# Altium footprint library texas.PCBLIB: 124 footprints (part 11 of 12)
Each footprint in its own frame and in the unit in brackets; x right, y up, seen from the top. Pads: shape width x height; smd on the part's side, far side on the other; paste and mask are expansions set on the pad; w line width, h text height; cw(c..) or ccw(c..) is an arc to the next point about the centre after c.
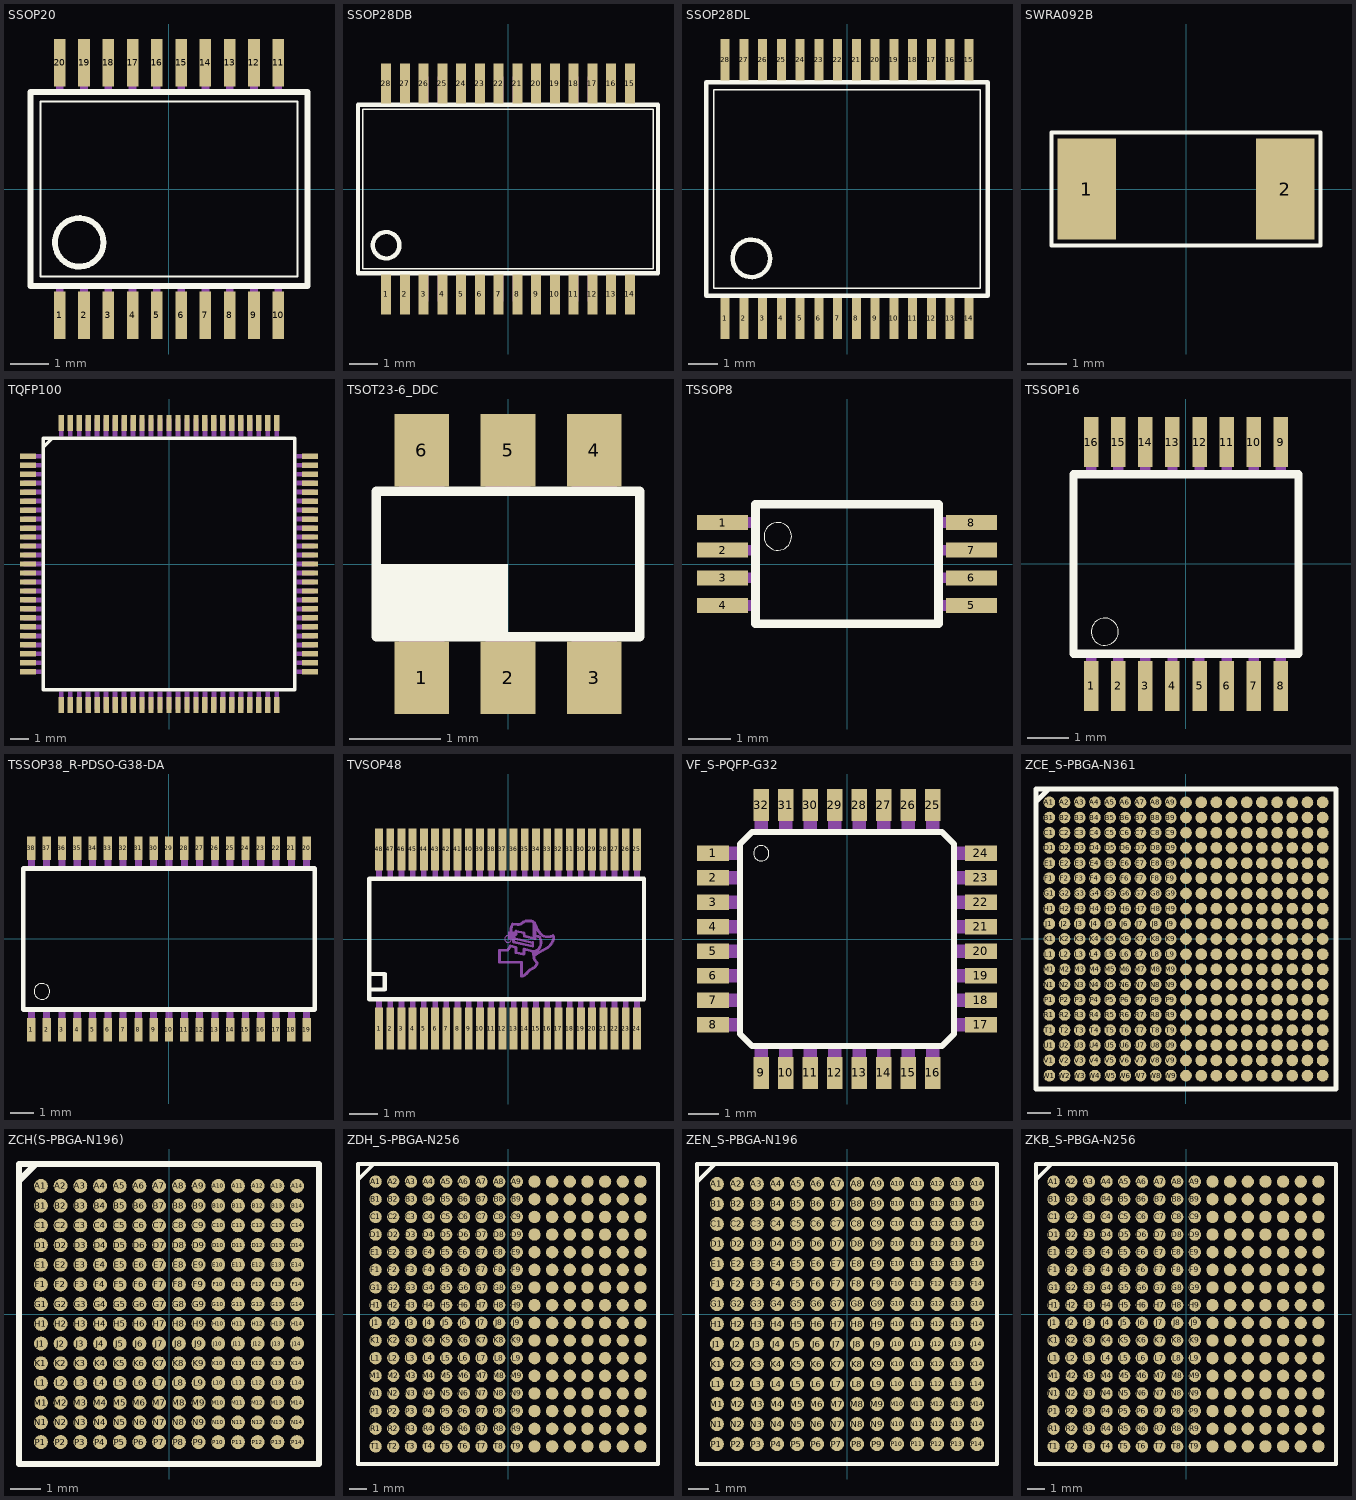
[diagram p10: the footprints below, top view; thin cyan lines are the x and y axes]

## SSOP20 [mil]
pads (20):
  rect 12.01x49.02 smd: 1(-112.48,-130) 2(-87.48,-130) 3(-62.48,-130) 4(-37.48,-130) 5(-12.48,-130) 6(12.52,-130) 7(37.52,-130) 8(62.52,-130) 9(87.52,-130) 10(112.52,-130) 11(112.52,130) 12(87.52,130) 13(62.52,130) 14(37.52,130) 15(12.52,130) 16(-12.48,130) 17(-37.48,130) 18(-62.48,130) 19(-87.48,130) 20(-112.48,130)
Top Overlay:
  circle w6: c-92.48,-55 r25
  lines w2: -132.48,-90 132.52,-90 132.52,90 -132.48,90 -132.48,-90
  lines w6: -142.48,-100 142.52,-100 142.52,100 -142.48,100 -142.48,-100
Mechanical 16:
  rectangle: 108.52,102 116.52,135
  rectangle: 83.52,102 91.52,135
  rectangle: 58.52,102 66.52,135
  rectangle: 33.52,102 41.52,135
  rectangle: 8.52,102 16.52,135
  rectangle: -16.48,102 -8.48,135
  rectangle: -41.48,102 -33.48,135
  rectangle: -66.48,102 -58.48,135
  rectangle: -91.48,102 -83.48,135
  rectangle: -116.48,102 -108.48,135
  rectangle: -116.48,-135 -108.48,-102
  rectangle: -91.48,-135 -83.48,-102
  rectangle: -66.48,-135 -58.48,-102
  rectangle: -41.48,-135 -33.48,-102
  rectangle: -16.48,-135 -8.48,-102
  rectangle: 8.52,-135 16.52,-102
  rectangle: 33.52,-135 41.52,-102
  rectangle: 58.52,-135 66.52,-102
  rectangle: 83.52,-135 91.52,-102
  rectangle: 108.52,-135 116.52,-102

## SSOP28DB [mil]
pads (28):
  rect 13.7x55 smd: 1(-166.34,-143.94) 2(-140.75,-143.94) 3(-115.16,-143.94) 4(-89.57,-143.94) 5(-63.98,-143.94) 6(-38.39,-143.94) 7(-12.8,-143.94) 8(12.8,-143.94) 9(38.39,-143.94) 10(63.98,-143.94) 11(89.57,-143.94) 12(115.16,-143.94) 13(140.75,-143.94) 14(166.34,-143.94) 15(166.34,143.94) 16(140.75,143.94) 17(115.16,143.94) 18(89.57,143.94) 19(63.98,143.94) 20(38.39,143.94) 21(12.8,143.94) 22(-12.8,143.94) 23(-38.39,143.94) 24(-63.98,143.94) 25(-89.57,143.94) 26(-115.16,143.94) 27(-140.75,143.94) 28(-166.34,143.94)
Top Overlay:
  circle w6: c-166.34,-76.77 r18.09
  lines w2: -198.35,-108.78 198.35,-108.78 198.35,108.78 -198.35,108.78 -198.35,-108.78
  lines w6: -204.72,-115.16 204.72,-115.16 204.72,115.16 -204.72,115.16 -204.72,-115.16
Mechanical 16:
  rectangle: -172.74,116.76 -159.94,153.54
  rectangle: -172.74,-153.54 -159.94,-116.76
  rectangle: -147.15,-153.54 -134.35,-116.76
  rectangle: -121.56,-153.54 -108.76,-116.76
  rectangle: -147.15,116.76 -134.35,153.54
  rectangle: -121.56,116.76 -108.76,153.54
  rectangle: -95.96,116.76 -83.17,153.54
  rectangle: -70.37,116.76 -57.58,153.54
  rectangle: -44.78,116.76 -31.99,153.54
  rectangle: -19.19,116.76 -6.4,153.54
  rectangle: 6.4,116.76 19.19,153.54
  rectangle: 31.99,116.76 44.78,153.54
  rectangle: 57.58,116.76 70.37,153.54
  rectangle: 83.17,116.76 95.96,153.54
  rectangle: 108.76,116.76 121.56,153.54
  rectangle: 134.35,116.76 147.15,153.54
  rectangle: 159.94,116.76 172.74,153.54
  rectangle: -95.96,-153.54 -83.17,-116.76
  rectangle: -70.37,-153.54 -57.58,-116.76
  rectangle: -44.78,-153.54 -31.99,-116.76
  rectangle: -19.19,-153.54 -6.4,-116.76
  rectangle: 6.4,-153.54 19.19,-116.76
  rectangle: 31.99,-153.54 44.78,-116.76
  rectangle: 57.58,-153.54 70.37,-116.76
  rectangle: 83.17,-153.54 95.96,-116.76
  rectangle: 108.76,-153.54 121.56,-116.76
  rectangle: 134.35,-153.54 147.15,-116.76
  rectangle: 159.94,-153.54 172.74,-116.76

## SSOP28DL [mil]
pads (28):
  rect 12x55 smd: 1(-162.5,-172.5) 2(-137.5,-172.5) 3(-112.5,-172.5) 4(-87.5,-172.5) 5(-62.5,-172.5) 6(-37.5,-172.5) 7(-12.5,-172.5) 8(12.5,-172.5) 9(37.5,-172.5) 10(62.5,-172.5) 11(87.5,-172.5) 12(112.5,-172.5) 13(137.5,-172.5) 14(162.5,-172.5) 15(162.5,172.5) 16(137.5,172.5) 17(112.5,172.5) 18(87.5,172.5) 19(62.5,172.5) 20(37.5,172.5) 21(12.5,172.5) 22(-12.5,172.5) 23(-37.5,172.5) 24(-62.5,172.5) 25(-87.5,172.5) 26(-112.5,172.5) 27(-137.5,172.5) 28(-162.5,172.5)
Top Overlay:
  circle w6: c-127.5,-92.5 r25
  lines w2: -177.52,-132.52 177.52,-132.52 177.52,132.52 -177.52,132.52 -177.52,-132.52
  lines w6: -187.52,-142.52 187.52,-142.52 187.52,142.52 -187.52,142.52 -187.52,-142.52
Mechanical 16:
  rectangle: -166.5,144.5 -158.5,177.5
  rectangle: -141.5,144.5 -133.5,177.5
  rectangle: -116.5,144.5 -108.5,177.5
  rectangle: -91.5,144.5 -83.5,177.5
  rectangle: -66.5,144.5 -58.5,177.5
  rectangle: -41.5,144.5 -33.5,177.5
  rectangle: -16.5,144.5 -8.5,177.5
  rectangle: 8.5,144.5 16.5,177.5
  rectangle: 33.5,144.5 41.5,177.5
  rectangle: 58.5,144.5 66.5,177.5
  rectangle: 83.5,144.5 91.5,177.5
  rectangle: 108.5,144.5 116.5,177.5
  rectangle: 133.5,144.5 141.5,177.5
  rectangle: 158.5,144.5 166.5,177.5
  rectangle: 158.5,-177.5 166.5,-144.5
  rectangle: 133.5,-177.5 141.5,-144.5
  rectangle: 108.5,-177.5 116.5,-144.5
  rectangle: 83.5,-177.5 91.5,-144.5
  rectangle: 58.5,-177.5 66.5,-144.5
  rectangle: 33.5,-177.5 41.5,-144.5
  rectangle: 8.5,-177.5 16.5,-144.5
  rectangle: -16.5,-177.5 -8.5,-144.5
  rectangle: -41.5,-177.5 -33.5,-144.5
  rectangle: -66.5,-177.5 -58.5,-144.5
  rectangle: -91.5,-177.5 -83.5,-144.5
  rectangle: -116.5,-177.5 -108.5,-144.5
  rectangle: -141.5,-177.5 -133.5,-144.5
  rectangle: -166.5,-177.5 -158.5,-144.5

## SWRA092B [mm]
pads (2):
  rect 1.5x2.6 smd: 1(-2.55,0) 2(2.55,0)
Top Overlay:
  lines w0.102: -3.45,-1.45 3.45,-1.45 3.45,1.45 -3.45,1.45 -3.45,-1.45

## TQFP100 [mm]
pads (100):
  rect 0.9x0.3 smd: 1(-7.85,6) 2(-7.85,5.5) 3(-7.85,5) 4(-7.85,4.5) 5(-7.85,4) 6(-7.85,3.5) 7(-7.85,3) 8(-7.85,2.5) 9(-7.85,2) 10(-7.85,1.5) 11(-7.85,1) 12(-7.85,0.5) 13(-7.85,0) 14(-7.85,-0.5) 15(-7.85,-1) 16(-7.85,-1.5) 17(-7.85,-2) 18(-7.85,-2.5) 19(-7.85,-3) 20(-7.85,-3.5) 21(-7.85,-4) 22(-7.85,-4.5) 23(-7.85,-5) 24(-7.85,-5.5) 25(-7.85,-6) 51(7.85,-6) 52(7.85,-5.5) 53(7.85,-5) 54(7.85,-4.5) 55(7.85,-4) 56(7.85,-3.5) 57(7.85,-3) 58(7.85,-2.5) 59(7.85,-2) 60(7.85,-1.5) 61(7.85,-1) 62(7.85,-0.5) 63(7.85,0) 64(7.85,0.5) 65(7.85,1) 66(7.85,1.5) 67(7.85,2) 68(7.85,2.5) 69(7.85,3) 70(7.85,3.5) 71(7.85,4) 72(7.85,4.5) 73(7.85,5) 74(7.85,5.5) 75(7.85,6)
  rect 0.3x0.9 smd: 26(-6,-7.85) 27(-5.5,-7.85) 28(-5,-7.85) 29(-4.5,-7.85) 30(-4,-7.85) 31(-3.5,-7.85) 32(-3,-7.85) 33(-2.5,-7.85) 34(-2,-7.85) 35(-1.5,-7.85) 36(-1,-7.85) 37(-0.5,-7.85) 38(0,-7.85) 39(0.5,-7.85) 40(1,-7.85) 41(1.5,-7.85) 42(2,-7.85) 43(2.5,-7.85) 44(3,-7.85) 45(3.5,-7.85) 46(4,-7.85) 47(4.5,-7.85) 48(5,-7.85) 49(5.5,-7.85) 50(6,-7.85) 76(6,7.85) 77(5.5,7.85) 78(5,7.85) 79(4.5,7.85) 80(4,7.85) 81(3.5,7.85) 82(3,7.85) 83(2.5,7.85) 84(2,7.85) 85(1.5,7.85) 86(1,7.85) 87(0.5,7.85) 88(0,7.85) 89(-0.5,7.85) 90(-1,7.85) 91(-1.5,7.85) 92(-2,7.85) 93(-2.5,7.85) 94(-3,7.85) 95(-3.5,7.85) 96(-4,7.85) 97(-4.5,7.85) 98(-5,7.85) 99(-5.5,7.85) 100(-6,7.85)
Top Overlay:
  lines w0.203: -6.998,6.5 -6.5,6.998 ; -6.998,-6.998 6.998,-6.998 6.998,6.998 -6.998,6.998 -6.998,-6.998
Top Paste:
  rectangle: -8.225,5.875 -7.425,6.125
  rectangle: -8.225,5.375 -7.425,5.625
  rectangle: -8.225,4.875 -7.425,5.125
  rectangle: -8.225,4.375 -7.425,4.625
  rectangle: -8.225,3.875 -7.425,4.125
  rectangle: -8.225,3.375 -7.425,3.625
  rectangle: -8.225,2.875 -7.425,3.125
  rectangle: -8.225,2.375 -7.425,2.625
  rectangle: -8.225,1.875 -7.425,2.125
  rectangle: -8.225,1.375 -7.425,1.625
  rectangle: -8.225,0.875 -7.425,1.125
  rectangle: -8.225,0.375 -7.425,0.625
  rectangle: -8.225,-0.125 -7.425,0.125
  rectangle: -8.225,-0.625 -7.425,-0.375
  rectangle: -8.225,-1.125 -7.425,-0.875
  rectangle: -8.225,-1.625 -7.425,-1.375
  rectangle: -8.225,-2.125 -7.425,-1.875
  rectangle: -8.225,-2.625 -7.425,-2.375
  rectangle: -8.225,-3.125 -7.425,-2.875
  rectangle: -8.225,-3.625 -7.425,-3.375
  rectangle: -8.225,-4.125 -7.425,-3.875
  rectangle: -8.225,-4.625 -7.425,-4.375
  rectangle: -8.225,-5.125 -7.425,-4.875
  rectangle: -8.225,-5.625 -7.425,-5.375
  rectangle: -8.225,-6.125 -7.425,-5.875
  region: -5.875,-8.225 -5.875,-7.425 -6.125,-7.425 -6.125,-8.225
  region: -5.375,-8.225 -5.375,-7.425 -5.625,-7.425 -5.625,-8.225
  region: -4.875,-8.225 -4.875,-7.425 -5.125,-7.425 -5.125,-8.225
  region: -4.375,-8.225 -4.375,-7.425 -4.625,-7.425 -4.625,-8.225
  region: -3.875,-8.225 -3.875,-7.425 -4.125,-7.425 -4.125,-8.225
  region: -3.375,-8.225 -3.375,-7.425 -3.625,-7.425 -3.625,-8.225
  region: -2.875,-8.225 -2.875,-7.425 -3.125,-7.425 -3.125,-8.225
  region: -2.375,-8.225 -2.375,-7.425 -2.625,-7.425 -2.625,-8.225
  region: -1.875,-8.225 -1.875,-7.425 -2.125,-7.425 -2.125,-8.225
  region: -1.375,-8.225 -1.375,-7.425 -1.625,-7.425 -1.625,-8.225
  region: -0.875,-8.225 -0.875,-7.425 -1.125,-7.425 -1.125,-8.225
  region: -0.375,-8.225 -0.375,-7.425 -0.625,-7.425 -0.625,-8.225
  region: 0.125,-8.225 0.125,-7.425 -0.125,-7.425 -0.125,-8.225
  region: 0.625,-8.225 0.625,-7.425 0.375,-7.425 0.375,-8.225
  region: 1.125,-8.225 1.125,-7.425 0.875,-7.425 0.875,-8.225
  region: 1.625,-8.225 1.625,-7.425 1.375,-7.425 1.375,-8.225
  region: 2.125,-8.225 2.125,-7.425 1.875,-7.425 1.875,-8.225
  region: 2.625,-8.225 2.625,-7.425 2.375,-7.425 2.375,-8.225
  region: 3.125,-8.225 3.125,-7.425 2.875,-7.425 2.875,-8.225
  region: 3.625,-8.225 3.625,-7.425 3.375,-7.425 3.375,-8.225
  region: 4.125,-8.225 4.125,-7.425 3.875,-7.425 3.875,-8.225
  region: 4.625,-8.225 4.625,-7.425 4.375,-7.425 4.375,-8.225
  region: 5.125,-8.225 5.125,-7.425 4.875,-7.425 4.875,-8.225
  region: 5.625,-8.225 5.625,-7.425 5.375,-7.425 5.375,-8.225
  region: 6.125,-8.225 6.125,-7.425 5.875,-7.425 5.875,-8.225
  region: 8.225,-5.875 7.425,-5.875 7.425,-6.125 8.225,-6.125
  region: 8.225,-5.375 7.425,-5.375 7.425,-5.625 8.225,-5.625
  region: 8.225,-4.875 7.425,-4.875 7.425,-5.125 8.225,-5.125
  region: 8.225,-4.375 7.425,-4.375 7.425,-4.625 8.225,-4.625
  region: 8.225,-3.875 7.425,-3.875 7.425,-4.125 8.225,-4.125
  region: 8.225,-3.375 7.425,-3.375 7.425,-3.625 8.225,-3.625
  region: 8.225,-2.875 7.425,-2.875 7.425,-3.125 8.225,-3.125
  region: 8.225,-2.375 7.425,-2.375 7.425,-2.625 8.225,-2.625
  region: 8.225,-1.875 7.425,-1.875 7.425,-2.125 8.225,-2.125
  region: 8.225,-1.375 7.425,-1.375 7.425,-1.625 8.225,-1.625
  region: 8.225,-0.875 7.425,-0.875 7.425,-1.125 8.225,-1.125
  region: 8.225,-0.375 7.425,-0.375 7.425,-0.625 8.225,-0.625
  region: 8.225,0.125 7.425,0.125 7.425,-0.125 8.225,-0.125
  region: 8.225,0.625 7.425,0.625 7.425,0.375 8.225,0.375
  region: 8.225,1.125 7.425,1.125 7.425,0.875 8.225,0.875
  region: 8.225,1.625 7.425,1.625 7.425,1.375 8.225,1.375
  region: 8.225,2.125 7.425,2.125 7.425,1.875 8.225,1.875
  region: 8.225,2.625 7.425,2.625 7.425,2.375 8.225,2.375
  region: 8.225,3.125 7.425,3.125 7.425,2.875 8.225,2.875
  region: 8.225,3.625 7.425,3.625 7.425,3.375 8.225,3.375
  region: 8.225,4.125 7.425,4.125 7.425,3.875 8.225,3.875
  region: 8.225,4.625 7.425,4.625 7.425,4.375 8.225,4.375
  region: 8.225,5.125 7.425,5.125 7.425,4.875 8.225,4.875
  region: 8.225,5.625 7.425,5.625 7.425,5.375 8.225,5.375
  region: 8.225,6.125 7.425,6.125 7.425,5.875 8.225,5.875
  region: 5.875,8.225 5.875,7.425 6.125,7.425 6.125,8.225
  region: 5.375,8.225 5.375,7.425 5.625,7.425 5.625,8.225
  region: 4.875,8.225 4.875,7.425 5.125,7.425 5.125,8.225
  region: 4.375,8.225 4.375,7.425 4.625,7.425 4.625,8.225
  region: 3.875,8.225 3.875,7.425 4.125,7.425 4.125,8.225
  region: 3.375,8.225 3.375,7.425 3.625,7.425 3.625,8.225
  region: 2.875,8.225 2.875,7.425 3.125,7.425 3.125,8.225
  region: 2.375,8.225 2.375,7.425 2.625,7.425 2.625,8.225
  region: 1.875,8.225 1.875,7.425 2.125,7.425 2.125,8.225
  region: 1.375,8.225 1.375,7.425 1.625,7.425 1.625,8.225
  region: 0.875,8.225 0.875,7.425 1.125,7.425 1.125,8.225
  region: 0.375,8.225 0.375,7.425 0.625,7.425 0.625,8.225
  region: -0.125,8.225 -0.125,7.425 0.125,7.425 0.125,8.225
  region: -0.625,8.225 -0.625,7.425 -0.375,7.425 -0.375,8.225
  region: -1.125,8.225 -1.125,7.425 -0.875,7.425 -0.875,8.225
  region: -1.625,8.225 -1.625,7.425 -1.375,7.425 -1.375,8.225
  region: -2.125,8.225 -2.125,7.425 -1.875,7.425 -1.875,8.225
  region: -2.625,8.225 -2.625,7.425 -2.375,7.425 -2.375,8.225
  region: -3.125,8.225 -3.125,7.425 -2.875,7.425 -2.875,8.225
  region: -3.625,8.225 -3.625,7.425 -3.375,7.425 -3.375,8.225
  region: -4.125,8.225 -4.125,7.425 -3.875,7.425 -3.875,8.225
  region: -4.625,8.225 -4.625,7.425 -4.375,7.425 -4.375,8.225
  region: -5.125,8.225 -5.125,7.425 -4.875,7.425 -4.875,8.225
  region: -5.625,8.225 -5.625,7.425 -5.375,7.425 -5.375,8.225
  region: -6.125,8.225 -6.125,7.425 -5.875,7.425 -5.875,8.225
Top Solder:
  rectangle: -8.35,5.825 -7.3,6.175
  rectangle: -8.35,5.325 -7.3,5.675
  rectangle: -8.35,4.825 -7.3,5.175
  rectangle: -8.35,4.325 -7.3,4.675
  rectangle: -8.35,3.825 -7.3,4.175
  rectangle: -8.35,3.325 -7.3,3.675
  rectangle: -8.35,2.825 -7.3,3.175
  rectangle: -8.35,2.325 -7.3,2.675
  rectangle: -8.35,1.825 -7.3,2.175
  rectangle: -8.35,1.325 -7.3,1.675
  rectangle: -8.35,0.825 -7.3,1.175
  rectangle: -8.35,0.325 -7.3,0.675
  rectangle: -8.35,-0.175 -7.3,0.175
  rectangle: -8.35,-0.675 -7.3,-0.325
  rectangle: -8.35,-1.175 -7.3,-0.825
  rectangle: -8.35,-1.675 -7.3,-1.325
  rectangle: -8.35,-2.175 -7.3,-1.825
  rectangle: -8.35,-2.675 -7.3,-2.325
  rectangle: -8.35,-3.175 -7.3,-2.825
  rectangle: -8.35,-3.675 -7.3,-3.325
  rectangle: -8.35,-4.175 -7.3,-3.825
  rectangle: -8.35,-4.675 -7.3,-4.325
  rectangle: -8.35,-5.175 -7.3,-4.825
  rectangle: -8.35,-5.675 -7.3,-5.325
  rectangle: -8.35,-6.175 -7.3,-5.825
  region: -5.825,-8.35 -5.825,-7.3 -6.175,-7.3 -6.175,-8.35
  region: -5.325,-8.35 -5.325,-7.3 -5.675,-7.3 -5.675,-8.35
  region: -4.825,-8.35 -4.825,-7.3 -5.175,-7.3 -5.175,-8.35
  region: -4.325,-8.35 -4.325,-7.3 -4.675,-7.3 -4.675,-8.35
  region: -3.825,-8.35 -3.825,-7.3 -4.175,-7.3 -4.175,-8.35
  region: -3.325,-8.35 -3.325,-7.3 -3.675,-7.3 -3.675,-8.35
  region: -2.825,-8.35 -2.825,-7.3 -3.175,-7.3 -3.175,-8.35
  region: -2.325,-8.35 -2.325,-7.3 -2.675,-7.3 -2.675,-8.35
  region: -1.825,-8.35 -1.825,-7.3 -2.175,-7.3 -2.175,-8.35
  region: -1.325,-8.35 -1.325,-7.3 -1.675,-7.3 -1.675,-8.35
  region: -0.825,-8.35 -0.825,-7.3 -1.175,-7.3 -1.175,-8.35
  region: -0.325,-8.35 -0.325,-7.3 -0.675,-7.3 -0.675,-8.35
  region: 0.175,-8.35 0.175,-7.3 -0.175,-7.3 -0.175,-8.35
  region: 0.675,-8.35 0.675,-7.3 0.325,-7.3 0.325,-8.35
  region: 1.175,-8.35 1.175,-7.3 0.825,-7.3 0.825,-8.35
  region: 1.675,-8.35 1.675,-7.3 1.325,-7.3 1.325,-8.35
  region: 2.175,-8.35 2.175,-7.3 1.825,-7.3 1.825,-8.35
  region: 2.675,-8.35 2.675,-7.3 2.325,-7.3 2.325,-8.35
  region: 3.175,-8.35 3.175,-7.3 2.825,-7.3 2.825,-8.35
  region: 3.675,-8.35 3.675,-7.3 3.325,-7.3 3.325,-8.35
  region: 4.175,-8.35 4.175,-7.3 3.825,-7.3 3.825,-8.35
  region: 4.675,-8.35 4.675,-7.3 4.325,-7.3 4.325,-8.35
  region: 5.175,-8.35 5.175,-7.3 4.825,-7.3 4.825,-8.35
  region: 5.675,-8.35 5.675,-7.3 5.325,-7.3 5.325,-8.35
  region: 6.175,-8.35 6.175,-7.3 5.825,-7.3 5.825,-8.35
  region: 8.35,-5.825 7.3,-5.825 7.3,-6.175 8.35,-6.175
  region: 8.35,-5.325 7.3,-5.325 7.3,-5.675 8.35,-5.675
  region: 8.35,-4.825 7.3,-4.825 7.3,-5.175 8.35,-5.175
  region: 8.35,-4.325 7.3,-4.325 7.3,-4.675 8.35,-4.675
  region: 8.35,-3.825 7.3,-3.825 7.3,-4.175 8.35,-4.175
  region: 8.35,-3.325 7.3,-3.325 7.3,-3.675 8.35,-3.675
  region: 8.35,-2.825 7.3,-2.825 7.3,-3.175 8.35,-3.175
  region: 8.35,-2.325 7.3,-2.325 7.3,-2.675 8.35,-2.675
  region: 8.35,-1.825 7.3,-1.825 7.3,-2.175 8.35,-2.175
  region: 8.35,-1.325 7.3,-1.325 7.3,-1.675 8.35,-1.675
  region: 8.35,-0.825 7.3,-0.825 7.3,-1.175 8.35,-1.175
  region: 8.35,-0.325 7.3,-0.325 7.3,-0.675 8.35,-0.675
  region: 8.35,0.175 7.3,0.175 7.3,-0.175 8.35,-0.175
  region: 8.35,0.675 7.3,0.675 7.3,0.325 8.35,0.325
  region: 8.35,1.175 7.3,1.175 7.3,0.825 8.35,0.825
  region: 8.35,1.675 7.3,1.675 7.3,1.325 8.35,1.325
  region: 8.35,2.175 7.3,2.175 7.3,1.825 8.35,1.825
  region: 8.35,2.675 7.3,2.675 7.3,2.325 8.35,2.325
  region: 8.35,3.175 7.3,3.175 7.3,2.825 8.35,2.825
  region: 8.35,3.675 7.3,3.675 7.3,3.325 8.35,3.325
  region: 8.35,4.175 7.3,4.175 7.3,3.825 8.35,3.825
  region: 8.35,4.675 7.3,4.675 7.3,4.325 8.35,4.325
  region: 8.35,5.175 7.3,5.175 7.3,4.825 8.35,4.825
  region: 8.35,5.675 7.3,5.675 7.3,5.325 8.35,5.325
  region: 8.35,6.175 7.3,6.175 7.3,5.825 8.35,5.825
  region: 5.825,8.35 5.825,7.3 6.175,7.3 6.175,8.35
  region: 5.325,8.35 5.325,7.3 5.675,7.3 5.675,8.35
  region: 4.825,8.35 4.825,7.3 5.175,7.3 5.175,8.35
  region: 4.325,8.35 4.325,7.3 4.675,7.3 4.675,8.35
  region: 3.825,8.35 3.825,7.3 4.175,7.3 4.175,8.35
  region: 3.325,8.35 3.325,7.3 3.675,7.3 3.675,8.35
  region: 2.825,8.35 2.825,7.3 3.175,7.3 3.175,8.35
  region: 2.325,8.35 2.325,7.3 2.675,7.3 2.675,8.35
  region: 1.825,8.35 1.825,7.3 2.175,7.3 2.175,8.35
  region: 1.325,8.35 1.325,7.3 1.675,7.3 1.675,8.35
  region: 0.825,8.35 0.825,7.3 1.175,7.3 1.175,8.35
  region: 0.325,8.35 0.325,7.3 0.675,7.3 0.675,8.35
  region: -0.175,8.35 -0.175,7.3 0.175,7.3 0.175,8.35
  region: -0.675,8.35 -0.675,7.3 -0.325,7.3 -0.325,8.35
  region: -1.175,8.35 -1.175,7.3 -0.825,7.3 -0.825,8.35
  region: -1.675,8.35 -1.675,7.3 -1.325,7.3 -1.325,8.35
  region: -2.175,8.35 -2.175,7.3 -1.825,7.3 -1.825,8.35
  region: -2.675,8.35 -2.675,7.3 -2.325,7.3 -2.325,8.35
  region: -3.175,8.35 -3.175,7.3 -2.825,7.3 -2.825,8.35
  region: -3.675,8.35 -3.675,7.3 -3.325,7.3 -3.325,8.35
  region: -4.175,8.35 -4.175,7.3 -3.825,7.3 -3.825,8.35
  region: -4.675,8.35 -4.675,7.3 -4.325,7.3 -4.325,8.35
  region: -5.175,8.35 -5.175,7.3 -4.825,7.3 -4.825,8.35
  region: -5.675,8.35 -5.675,7.3 -5.325,7.3 -5.325,8.35
  region: -6.175,8.35 -6.175,7.3 -5.825,7.3 -5.825,8.35
Mechanical 16:
  rectangle: -8.1,5.865 -7.1,6.135
  rectangle: -8.1,5.365 -7.1,5.635
  rectangle: -8.1,4.865 -7.1,5.135
  rectangle: -8.1,4.365 -7.1,4.635
  rectangle: -8.1,3.865 -7.1,4.135
  rectangle: -8.1,3.365 -7.1,3.635
  rectangle: -8.1,2.865 -7.1,3.135
  rectangle: -8.1,2.365 -7.1,2.635
  rectangle: -8.1,1.865 -7.1,2.135
  rectangle: -8.1,1.365 -7.1,1.635
  rectangle: -8.1,0.865 -7.1,1.135
  rectangle: -8.1,0.365 -7.1,0.635
  rectangle: -8.1,-0.135 -7.1,0.135
  rectangle: -8.1,-0.635 -7.1,-0.365
  rectangle: -8.1,-1.135 -7.1,-0.865
  rectangle: -8.1,-1.635 -7.1,-1.365
  rectangle: -8.1,-2.135 -7.1,-1.865
  rectangle: -8.1,-2.635 -7.1,-2.365
  rectangle: -8.1,-3.135 -7.1,-2.865
  rectangle: -8.1,-3.635 -7.1,-3.365
  rectangle: -8.1,-4.135 -7.1,-3.865
  rectangle: -8.1,-4.635 -7.1,-4.365
  rectangle: -8.1,-5.135 -7.1,-4.865
  rectangle: -8.1,-5.635 -7.1,-5.365
  rectangle: -8.1,-6.135 -7.1,-5.865
  rectangle: -6.135,-8.1 -5.865,-7.1
  rectangle: -5.635,-8.1 -5.365,-7.1
  rectangle: -5.135,-8.1 -4.865,-7.1
  rectangle: -4.635,-8.1 -4.365,-7.1
  rectangle: -4.135,-8.1 -3.865,-7.1
  rectangle: -3.635,-8.1 -3.365,-7.1
  rectangle: -3.135,-8.1 -2.865,-7.1
  rectangle: -2.635,-8.1 -2.365,-7.1
  rectangle: -2.135,-8.1 -1.865,-7.1
  rectangle: -1.635,-8.1 -1.365,-7.1
  rectangle: -1.135,-8.1 -0.865,-7.1
  rectangle: -0.635,-8.1 -0.365,-7.1
  rectangle: -0.135,-8.1 0.135,-7.1
  rectangle: 0.365,-8.1 0.635,-7.1
  rectangle: 0.865,-8.1 1.135,-7.1
  rectangle: 1.365,-8.1 1.635,-7.1
  rectangle: 1.865,-8.1 2.135,-7.1
  rectangle: 2.365,-8.1 2.635,-7.1
  rectangle: 2.865,-8.1 3.135,-7.1
  rectangle: 3.365,-8.1 3.635,-7.1
  rectangle: 3.865,-8.1 4.135,-7.1
  rectangle: 4.365,-8.1 4.635,-7.1
  rectangle: 4.865,-8.1 5.135,-7.1
  rectangle: 5.365,-8.1 5.635,-7.1
  rectangle: 5.865,-8.1 6.135,-7.1
  rectangle: 7.1,-6.135 8.1,-5.865
  rectangle: 7.1,-5.635 8.1,-5.365
  rectangle: 7.1,-5.135 8.1,-4.865
  rectangle: 7.1,-4.635 8.1,-4.365
  rectangle: 7.1,-4.135 8.1,-3.865
  rectangle: 7.1,-3.635 8.1,-3.365
  rectangle: 7.1,-3.135 8.1,-2.865
  rectangle: 7.1,-2.635 8.1,-2.365
  rectangle: 7.1,-2.135 8.1,-1.865
  rectangle: 7.1,-1.635 8.1,-1.365
  rectangle: 7.1,-1.135 8.1,-0.865
  rectangle: 7.1,-0.635 8.1,-0.365
  rectangle: 7.1,-0.135 8.1,0.135
  rectangle: 7.1,0.365 8.1,0.635
  rectangle: 7.1,0.865 8.1,1.135
  rectangle: 7.1,1.365 8.1,1.635
  rectangle: 7.1,1.865 8.1,2.135
  rectangle: 7.1,2.365 8.1,2.635
  rectangle: 7.1,2.865 8.1,3.135
  rectangle: 7.1,3.365 8.1,3.635
  rectangle: 7.1,3.865 8.1,4.135
  rectangle: 7.1,4.365 8.1,4.635
  rectangle: 7.1,4.865 8.1,5.135
  rectangle: 7.1,5.365 8.1,5.635
  rectangle: 7.1,5.865 8.1,6.135
  rectangle: 5.865,7.1 6.135,8.1
  rectangle: 5.365,7.1 5.635,8.1
  rectangle: 4.865,7.1 5.135,8.1
  rectangle: 4.365,7.1 4.635,8.1
  rectangle: 3.865,7.1 4.135,8.1
  rectangle: 3.365,7.1 3.635,8.1
  rectangle: 2.865,7.1 3.135,8.1
  rectangle: 2.365,7.1 2.635,8.1
  rectangle: 1.865,7.1 2.135,8.1
  rectangle: 1.365,7.1 1.635,8.1
  rectangle: 0.865,7.1 1.135,8.1
  rectangle: 0.365,7.1 0.635,8.1
  rectangle: -0.135,7.1 0.135,8.1
  rectangle: -0.635,7.1 -0.365,8.1
  rectangle: -1.135,7.1 -0.865,8.1
  rectangle: -1.635,7.1 -1.365,8.1
  rectangle: -2.135,7.1 -1.865,8.1
  rectangle: -2.635,7.1 -2.365,8.1
  rectangle: -3.135,7.1 -2.865,8.1
  rectangle: -3.635,7.1 -3.365,8.1
  rectangle: -4.135,7.1 -3.865,8.1
  rectangle: -4.635,7.1 -4.365,8.1
  rectangle: -5.135,7.1 -4.865,8.1
  rectangle: -5.635,7.1 -5.365,8.1
  rectangle: -6.135,7.1 -5.865,8.1
  rectangle: -8.1,5.365 -7.1,5.635
  rectangle: -8.1,4.865 -7.1,5.135
  rectangle: -8.1,4.365 -7.1,4.635
  rectangle: -8.1,3.865 -7.1,4.135

## TSOT23-6_DDC [mil]
pads (6):
  rect 23.62x31.5 smd: 1(-37.4,-49.21) 2(0,-49.21) 3(37.4,-49.21) 4(37.4,49.21) 5(0,49.21) 6(-37.4,49.21)
Top Overlay:
  rectangle: -56.1,-29.53 0,0
  lines w4: -57.09,-31.5 57.09,-31.5 57.09,31.5 -57.09,31.5 -57.09,-31.5
Mechanical 16:
  region: -27.56,-32.48 -47.24,-32.48 -47.24,-59.06 -27.56,-59.06
  region: 9.84,-32.48 -9.84,-32.48 -9.84,-59.06 9.84,-59.06
  region: 47.24,-32.48 27.56,-32.48 27.56,-59.06 47.24,-59.06
  rectangle: 27.56,32.48 47.24,59.06
  rectangle: -9.84,32.48 9.84,59.06
  rectangle: -47.24,32.48 -27.56,59.06

## TSSOP8 [mm]
pads (8):
  rect 1.2x0.35 smd: 1(-2.925,0.975) 2(-2.925,0.325) 3(-2.925,-0.325) 4(-2.925,-0.975) 5(2.925,-0.975) 6(2.925,-0.325) 7(2.925,0.325) 8(2.925,0.975)
Top Overlay:
  circle w0: c-1.625,0.65 r0.325
  lines w0.203: -2.15,-1.4 2.15,-1.4 2.15,1.4 -2.15,1.4 -2.15,-1.4
Mechanical 16:
  rectangle: -3.2,0.85 -2.2,1.1
  rectangle: -3.2,0.2 -2.2,0.45
  rectangle: -3.2,-0.45 -2.2,-0.2
  rectangle: -3.2,-1.1 -2.2,-0.85
  rectangle: 2.2,-1.1 3.2,-0.85
  rectangle: 2.2,-0.45 3.2,-0.2
  rectangle: 2.2,0.2 3.2,0.45
  rectangle: 2.2,0.85 3.2,1.1
